# Altium footprint library CubeSat-Backplane.PcbLib: 54 footprints (part 2 of 4)
Each footprint in its own frame and in the unit in brackets; x right, y up, seen from the top. Pads: shape width x height; smd on the part's side, far side on the other; paste and mask are expansions set on the pad; w line width, h text height; cw(c..) or ccw(c..) is an arc to the next point about the centre after c.
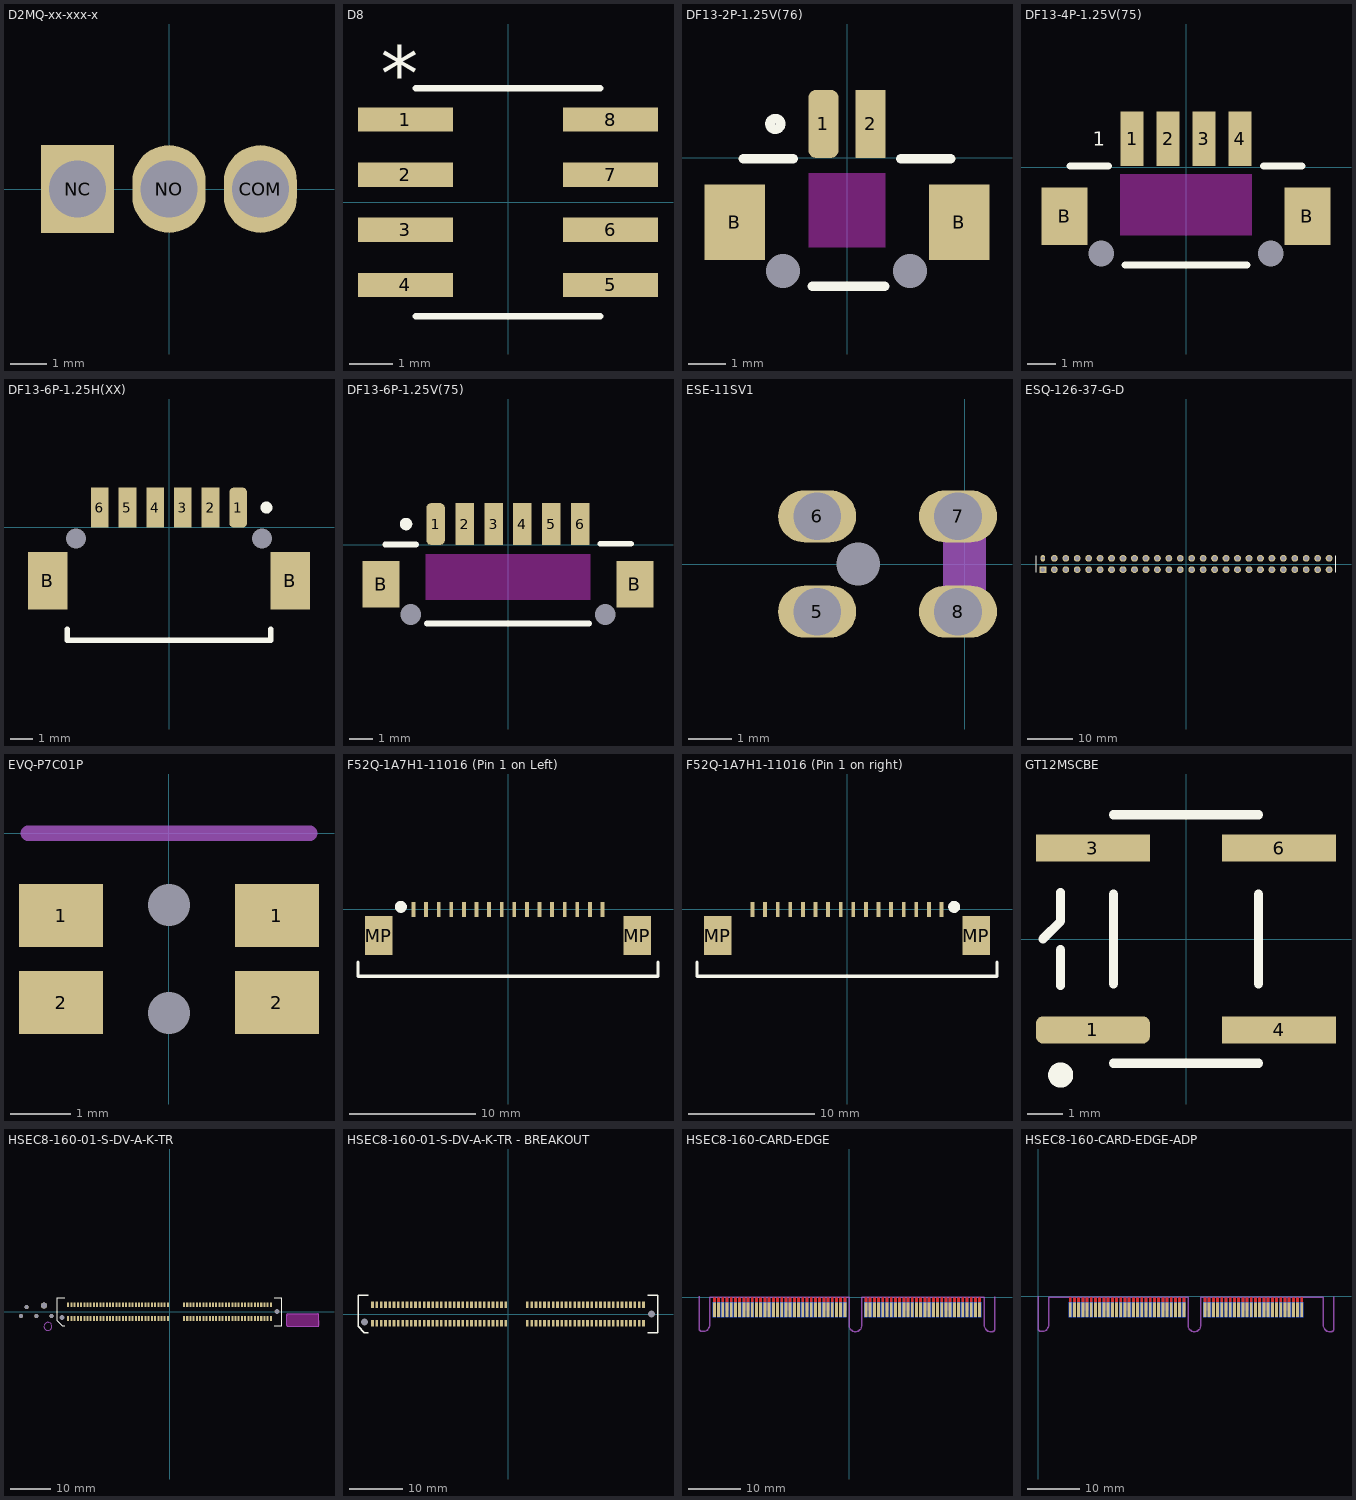
[diagram p1: the footprints below, top view; thin cyan lines are the x and y axes]

## D2MQ-xx-xxx-x [mm] "Switch SPDT Through Hole"
height 8.7
pads (3):
  oval 2x2.4 hole 1.55: COM(2.5,0) NO(0,0)
  rect 2x2.4 hole 1.55: NC(-2.5,0)
Bottom Overlay:
  lines w0.254: -3.75,-1.35 -4.1,-1.35 -4.1,1.35 -3.75,1.35 ; 3.75,-1.35 4.1,-1.35 4.1,1.35 3.75,1.35
3D body "D2MQ_4L_105_1.STEP": height 8.71, standoff -3.39, extent -4.1,-1.35 4.1,1.35

## D8 [mil]
pads (8):
  rect 86x22 smd paste+0 mask+0: 1(-93,75) 2(-93,25) 3(-93,-25) 4(-93,-75) 5(93,-75) 6(93,-25) 7(93,25) 8(93,75)
Top Overlay:
  lines w6: -83.5,-103.5 83.5,-103.5 ; -83.5,103.5 83.5,103.5
  text "*" at -115.5,92 h50
3D body: height 10, standoff 0, extent 0,0 10,10
3D body "D8.step": height 70.09, standoff 1, extent -122,-98.5 122.01,98.51

## DF13-2P-1.25V(76) [mm] "CONN HEADER SMD 2POS 1.25MM, TH PINS"
height 4.8
pads (6):
  rrect50% 0.8x1.8 smd: 1(-0.625,0.9)
  rect 0.8x1.8 smd: 2(0.625,0.9)
  rect 1.6x2 smd: B(-2.975,-1.7) B(2.975,-1.7)
  round 0 hole 0.9 unplated: TH(-1.7,-3) TH(1.675,-3)
Top Layer keep-out:
  rectangle: -1.025,-2.375 1.025,-0.4
Top Overlay:
  circle w0.254: c-1.9,0.9 r0.141
  lines w0.254: -2.75,-0.025 -1.425,-0.025 ; -0.925,-3.4 1,-3.4 ; 1.425,-0.025 2.75,-0.025
3D body "DF13-2P-1.25V.stp": height 4.81, standoff -0.79, extent -3.575,-3.4 3.575,1.5

## DF13-4P-1.25V(75) [mm] "CONN HEADER SMD 4POS 1.25MM, TH PINS"
height 4.8
pads (8):
  rect 0.8x1.9 smd: 1(-1.875,1) 2(-0.625,1) 3(0.625,1) 4(1.875,1)
  rect 1.6x2 smd: B(-4.225,-1.7) B(4.225,-1.7)
  round 0 hole 0.9 unplated: TH(-2.95,-3) TH(2.95,-3)
Top Layer keep-out:
  rectangle: -2.3,-2.375 2.3,-0.225
Top Overlay:
  lines w0.254: -4.038,0.05 -2.712,0.05 ; -2.125,-3.4 2.125,-3.4 ; 2.712,0.05 4.038,0.05
  text "1" at -3.25,0.75 h0.5
3D body "DF13-4P-1.25V.stp": height 4.81, standoff -0.79, extent -4.825,-3.4 4.825,1.5

## DF13-6P-1.25H(XX) [mm] "CONN HEADER SMD 6POS 1.25MM, RA - TH PINS"
height 3.6
pads (10):
  rrect50% 0.8x1.8 smd: 1(3.125,0.9)
  rect 0.8x1.8 smd: 2(1.875,0.9) 3(0.625,0.9) 4(-0.625,0.9) 5(-1.875,0.9) 6(-3.125,0.9)
  rect 1.8x2.6 smd: B(-5.475,-2.4) B(5.475,-2.4)
  round 0 hole 0.9 unplated: TH(-4.2,-0.5) TH(4.2,-0.5)
Top Overlay:
  circle w0.254: c4.4,0.9 r0.141
  lines w0.254: -4.6,-4.6 -4.6,-5.1 4.6,-5.1 4.6,-4.6
3D body "DF13-6P-1.25H.stp": height 3.61, standoff -0.79, extent -6.076,-5.1 6.076,1.4

## DF13-6P-1.25V(75) [mm] "CONN HEADER SMD 6POS 1.25MM, TH PINS"
height 4.8
pads (10):
  rrect50% 0.8x1.8 smd: 1(-3.125,0.9)
  rect 0.8x1.8 smd: 2(-1.875,0.9) 3(-0.625,0.9) 4(0.625,0.9) 5(1.875,0.9) 6(3.125,0.9)
  rect 1.6x2 smd: B(-5.475,-1.7) B(5.475,-1.7)
  round 0 hole 0.9 unplated: TH(-4.2,-3) TH(4.2,-3)
Top Layer keep-out:
  rectangle: -3.556,-2.375 3.556,-0.4
Top Overlay:
  circle w0.254: c-4.4,0.9 r0.141
  lines w0.254: -5.3,0.025 -3.975,0.025 ; -3.5,-3.4 3.5,-3.4 ; 3.982,0.05 5.308,0.05
3D body "DF13-6P-1.25V.stp": height 4.81, standoff -0.79, extent -6.075,-3.4 6.075,1.5

## ESE-11SV1 [mm] "SWITCH DETECTOR SPST-NO 10MA 5V"
height 8.5
pads (5):
  oval 1.8x1.2 hole 1.1: 5(-3.4,-1.1) 6(-3.4,1.1) 7(-0.15,1.1) 8(-0.15,-1.1)
  round 0 hole 1 unplated: 10(-2.45,0)
Mechanical 1:
  rectangle: -0.5,-0.635 0.5,0.635
  pour cut-out: -6.175,-1.475
3D body "ESE11SV1.step": height 10.7, standoff -0.5, extent -4.85,-2.098 1.55,2.099

## ESQ-126-37-G-D [mil] "CONN SOCKET 52POS 0.1 GOLD PCB"
height 435.04
pads (52):
  rect 60x60 hole 40 mask+3: 1(-1250,-50)
  oval 39.37x57.09 hole 25.59 mask+3: 2(-1250,50)
  round 60 hole 40 mask+3: 3(-1150,-50) 4(-1150,50) 5(-1050,-50) 6(-1050,50) 7(-950,-50) 8(-950,50) 9(-850,-50) 10(-850,50) 11(-750,-50) 12(-750,50) 13(-650,-50) 14(-650,50) 15(-550,-50) 16(-550,50) 17(-450,-50) 18(-450,50) 19(-350,-50) 20(-350,50) 21(-250,-50) 22(-250,50) 23(-150,-50) 24(-150,50) 25(-50,-50) 26(-50,50) 27(50,-50) 28(50,50) 29(150,-50) 30(150,50) 31(250,-50) 32(250,50) 33(350,-50) 34(350,50) 35(450,-50) 36(450,50) 37(550,-50) 38(550,50) 39(650,-50) 40(650,50) 41(750,-50) 42(750,50) 43(850,-50) 44(850,50) 45(950,-50) 46(950,50) 47(1050,-50) 48(1050,50) 49(1150,-50) 50(1150,50) 51(1250,-50) 52(1250,50)
Top Overlay:
  lines w10: -1310,-70 -1310,70 ; 1310,-70 1310,70
3D body "ESQ-126-37-G-D.stp": height 425.5, standoff -99.5, extent -1310,-100 1310,100

## EVQ-P7C01P [mm] "Tactile Switch SPST-NO Side Actuated Surface Mount, Right Angle"
height 1.35
pads (6):
  rect 1.4x1.05 smd: 1(-1.8,-1.375) 1(1.8,-1.375) 2(-1.8,-2.825) 2(1.8,-2.825)
  round 0 hole 0.7 unplated: TH(0,-3) TH(0,-1.2)
Board:
  lines w0.254: -2.35,0 2.35,0
3D body "EVQP7-LC-01P.SLDPRT": height 1.36, standoff -0.49, extent -2.35,-3.694 2.35,0

## F52Q-1A7H1-11016 (Pin 1 on Left) [mm] "FLEX CONNECTOR, 1.00MM PITCH, HE"
height 2
pads (18):
  rect 0.3x1.2 smd: 1(-7.5,0) 2(-6.5,0) 3(-5.5,0) 4(-4.5,0) 5(-3.5,0) 6(-2.5,0) 7(-1.5,0) 8(-0.5,0) 9(0.5,0) 10(1.5,0) 11(2.5,0) 12(3.5,0) 13(4.5,0) 14(5.5,0) 15(6.5,0) 16(7.5,0)
  rect 2.2x3.1 smd: MP(-10.25,-2.075) MP(10.25,-2.075)
Top Overlay:
  circle w0.5: c-8.5,0.2 r0.224
  lines w0.254: -11.9,-4.2 -11.9,-5.3 11.9,-5.3 11.9,-4.2
3D body "f52q_16pin_asm.stp": height 2.01, standoff -0.04, extent -11.9,-5.3 11.9,0.2

## F52Q-1A7H1-11016 (Pin 1 on right) [mm] "FLEX CONNECTOR, 1.00MM PITCH, HE"
height 2
pads (18):
  rect 0.3x1.2 smd: 1(7.5,0) 2(6.5,0) 3(5.5,0) 4(4.5,0) 5(3.5,0) 6(2.5,0) 7(1.5,0) 8(0.5,0) 9(-0.5,0) 10(-1.5,0) 11(-2.5,0) 12(-3.5,0) 13(-4.5,0) 14(-5.5,0) 15(-6.5,0) 16(-7.5,0)
  rect 2.2x3.1 smd: MP(-10.25,-2.075) MP(10.25,-2.075)
Top Overlay:
  circle w0.5: c8.5,0.2 r0.224
  lines w0.254: -11.9,-4.2 -11.9,-5.3 11.9,-5.3 11.9,-4.2
3D body "f52q_16pin_asm.stp": height 2.01, standoff -0.04, extent -11.9,-5.3 11.9,0.2

## GT12MSCBE [mm] "SWITCH TOGGLE SPST 0.4VA 20V, SMT"
height 5.41
pads (4):
  rrect50% 3.18x0.76 smd: 1(-2.6,-2.54)
  rect 3.18x0.76 smd: 3(-2.6,2.54) 4(2.6,-2.54) 6(2.6,2.54)
Top Overlay:
  circle w0.5: c-3.5,-3.8 r0.1
  lines w0.254: -4,0 -3.5,0.5 -3.5,1.3 ; -3.5,-1.3 -3.5,-0.3 ; -2.03,-3.47 2.03,-3.47 ; -2.03,-1.25 -2.03,1.25 ; -2.03,3.47 2.03,3.47 ; 2.03,-1.25 2.03,1.25
3D body: height 2.53, standoff -2.47, extent 0,0 0,0
3D body "GT12MSCBE.stp": height 11.37, standoff 0.01, extent -3.505,-3.505 3.505,3.505

## HSEC8-160-01-S-DV-A-K-TR [mm] "120 Position Female Connector Non Specified - Dual Edge Gold 0.031\" (0.80mm) Black"
height 7.98
pads (127):
  rect 0.5x1.2 smd mask+0.05: 1(-25.2,-1.7) 2(-25.2,1.7) 3(-24.4,-1.7) 4(-24.4,1.7) 5(-23.6,-1.7) 6(-23.6,1.7) 7(-22.8,-1.7) 8(-22.8,1.7) 9(-22,-1.7) 10(-22,1.7) 11(-21.2,-1.7) 12(-21.2,1.7) 13(-20.4,-1.7) 14(-20.4,1.7) 15(-19.6,-1.7) 16(-19.6,1.7) 17(-18.8,-1.7) 18(-18.8,1.7) 19(-18,-1.7) 20(-18,1.7) 21(-17.2,-1.7) 22(-17.2,1.7) 23(-16.4,-1.7) 24(-16.4,1.7) 25(-15.6,-1.7) 26(-15.6,1.7) 27(-14.8,-1.7) 28(-14.8,1.7) 29(-14,-1.7) 30(-14,1.7) 31(-13.2,-1.7) 32(-13.2,1.7) 33(-12.4,-1.7) 34(-12.4,1.7) 35(-11.6,-1.7) 36(-11.6,1.7) 37(-10.8,-1.7) 38(-10.8,1.7) 39(-10,-1.7) 40(-10,1.7) 41(-9.2,-1.7) 42(-9.2,1.7) 43(-8.4,-1.7) 44(-8.4,1.7) 45(-7.6,-1.7) 46(-7.6,1.7) 47(-6.8,-1.7) 48(-6.8,1.7) 49(-6,-1.7) 50(-6,1.7) 51(-5.2,-1.7) 52(-5.2,1.7) 53(-4.4,-1.7) 54(-4.4,1.7) 55(-3.6,-1.7) 56(-3.6,1.7) 57(-2.8,-1.7) 58(-2.8,1.7) 59(-2,-1.7) 60(-2,1.7) 61(-1.2,-1.7) 62(-1.2,1.7) 63(-0.4,-1.7) 64(-0.4,1.7) 65(3.6,-1.7) 66(3.6,1.7) 67(4.4,-1.7) 68(4.4,1.7) 69(5.2,-1.7) 70(5.2,1.7) 71(6,-1.7) 72(6,1.7) 73(6.8,-1.7) 74(6.8,1.7) 75(7.6,-1.7) 76(7.6,1.7) 77(8.4,-1.7) 78(8.4,1.7) 79(9.2,-1.7) 80(9.2,1.7) 81(10,-1.7) 82(10,1.7) 83(10.8,-1.7) 84(10.8,1.7) 85(11.6,-1.7) 86(11.6,1.7) 87(12.4,-1.7) 88(12.4,1.7) 89(13.2,-1.7) 90(13.2,1.7) 91(14,-1.7) 92(14,1.7) 93(14.8,-1.7) 94(14.8,1.7) 95(15.6,-1.7) 96(15.6,1.7) 97(16.4,-1.7) 98(16.4,1.7) 99(17.2,-1.7) 100(17.2,1.7) 101(18,-1.7) 102(18,1.7) 103(18.8,-1.7) 104(18.8,1.7) 105(19.6,-1.7) 106(19.6,1.7) 107(20.4,-1.7) 108(20.4,1.7) 109(21.2,-1.7) 110(21.2,1.7) 111(22,-1.7) 112(22,1.7) 113(22.8,-1.7) 114(22.8,1.7) 115(23.6,-1.7) 116(23.6,1.7) 117(24.4,-1.7) 118(24.4,1.7) 119(25.2,-1.7) 120(25.2,1.7)
  round 0 hole 1.27 unplated: MH1(-26.7,-1.5) MH2(26.7,0)
  round 1 hole 1 unplated: TH(-36.93,-1.1) TH(-35.53,1.1) TH(-33.13,-1.1) TH(-29.33,-1.1)
  round 1.5 hole 1.5 unplated: TH(-31.23,1.49)
Top Overlay:
  lines w0.254: -26,-3.5 -26.7,-3.5 -27.9,-2.3 -27.9,3.5 -26,3.5 ; 26,-3.5 27.9,-3.5 27.9,3.5 26,3.5
Keep-Out Layer:
  board cut-out: 37.157,-0.907 37.157,-3.343 37.157,-3.411 37.105,-3.536 37.01,-3.631 36.885,-3.683 36.817,-3.683 29.433,-3.683 29.374,-3.683 29.265,-3.638 29.182,-3.555 29.137,-3.446 29.137,-3.387 29.137,-0.863 29.137,-0.804 29.182,-0.694 29.266,-0.61 29.376,-0.565 29.435,-0.565 36.815,-0.565 36.883,-0.565 37.009,-0.617 37.105,-0.713 37.157,-0.839
Mechanical 1:
  circle w0.1: c-30.23,-3.69 r1
Dimensions:
  lines w0.203: 29.137,-0.833 29.137,-3.387 ccw(c29.433,-3.387) 29.433,-3.683 36.817,-3.683 ccw(c36.817,-3.343) 37.157,-3.343 37.157,-0.907 ; 29.139,-0.861 cw(c29.435,-0.861) 29.435,-0.565 36.815,-0.565 cw(c36.815,-0.907) 37.157,-0.907
3D body "HSEC8-160-01-S-DV-A-TR.stp": height 7.97, standoff -1.33, extent -27.9,-3.5 27.9,3.5

## HSEC8-160-01-S-DV-A-K-TR - BREAKOUT [mm] "120 Position Female Connector Non Specified - Dual Edge Gold 0.031\" (0.80mm) Black"
height 7.98
pads (122):
  rect 0.5x1.2 smd mask+0.05: 1(-25.2,-1.7) 2(-25.2,1.7) 3(-24.4,-1.7) 4(-24.4,1.7) 5(-23.6,-1.7) 6(-23.6,1.7) 7(-22.8,-1.7) 8(-22.8,1.7) 9(-22,-1.7) 10(-22,1.7) 11(-21.2,-1.7) 12(-21.2,1.7) 13(-20.4,-1.7) 14(-20.4,1.7) 15(-19.6,-1.7) 16(-19.6,1.7) 17(-18.8,-1.7) 18(-18.8,1.7) 19(-18,-1.7) 20(-18,1.7) 21(-17.2,-1.7) 22(-17.2,1.7) 23(-16.4,-1.7) 24(-16.4,1.7) 25(-15.6,-1.7) 26(-15.6,1.7) 27(-14.8,-1.7) 28(-14.8,1.7) 29(-14,-1.7) 30(-14,1.7) 31(-13.2,-1.7) 32(-13.2,1.7) 33(-12.4,-1.7) 34(-12.4,1.7) 35(-11.6,-1.7) 36(-11.6,1.7) 37(-10.8,-1.7) 38(-10.8,1.7) 39(-10,-1.7) 40(-10,1.7) 41(-9.2,-1.7) 42(-9.2,1.7) 43(-8.4,-1.7) 44(-8.4,1.7) 45(-7.6,-1.7) 46(-7.6,1.7) 47(-6.8,-1.7) 48(-6.8,1.7) 49(-6,-1.7) 50(-6,1.7) 51(-5.2,-1.7) 52(-5.2,1.7) 53(-4.4,-1.7) 54(-4.4,1.7) 55(-3.6,-1.7) 56(-3.6,1.7) 57(-2.8,-1.7) 58(-2.8,1.7) 59(-2,-1.7) 60(-2,1.7) 61(-1.2,-1.7) 62(-1.2,1.7) 63(-0.4,-1.7) 64(-0.4,1.7) 65(3.6,-1.7) 66(3.6,1.7) 67(4.4,-1.7) 68(4.4,1.7) 69(5.2,-1.7) 70(5.2,1.7) 71(6,-1.7) 72(6,1.7) 73(6.8,-1.7) 74(6.8,1.7) 75(7.6,-1.7) 76(7.6,1.7) 77(8.4,-1.7) 78(8.4,1.7) 79(9.2,-1.7) 80(9.2,1.7) 81(10,-1.7) 82(10,1.7) 83(10.8,-1.7) 84(10.8,1.7) 85(11.6,-1.7) 86(11.6,1.7) 87(12.4,-1.7) 88(12.4,1.7) 89(13.2,-1.7) 90(13.2,1.7) 91(14,-1.7) 92(14,1.7) 93(14.8,-1.7) 94(14.8,1.7) 95(15.6,-1.7) 96(15.6,1.7) 97(16.4,-1.7) 98(16.4,1.7) 99(17.2,-1.7) 100(17.2,1.7) 101(18,-1.7) 102(18,1.7) 103(18.8,-1.7) 104(18.8,1.7) 105(19.6,-1.7) 106(19.6,1.7) 107(20.4,-1.7) 108(20.4,1.7) 109(21.2,-1.7) 110(21.2,1.7) 111(22,-1.7) 112(22,1.7) 113(22.8,-1.7) 114(22.8,1.7) 115(23.6,-1.7) 116(23.6,1.7) 117(24.4,-1.7) 118(24.4,1.7) 119(25.2,-1.7) 120(25.2,1.7)
  round 0 hole 1.27 unplated: MH1(-26.7,-1.5) MH2(26.7,0)
Top Overlay:
  lines w0.254: -26,-3.5 -26.7,-3.5 -27.9,-2.3 -27.9,3.5 -26,3.5 ; 26,-3.5 27.9,-3.5 27.9,3.5 26,3.5
3D body "HSEC8-160-01-S-DV-A-TR.stp": height 7.97, standoff -1.33, extent -27.9,-3.5 27.9,3.5

## HSEC8-160-CARD-EDGE [mm] "PCB Card Edge Footprint for HSEC8-160"
pads (120):
  rect 0.55x2.8 smd far side paste-1 mask+0.2: 1(-25.6,-2.4) 3(-24.8,-2.4) 5(-24,-2.4) 7(-23.2,-2.4) 9(-22.4,-2.4) 11(-21.6,-2.4) 13(-20.8,-2.4) 15(-20,-2.4) 17(-19.2,-2.4) 19(-18.4,-2.4) 21(-17.6,-2.4) 23(-16.8,-2.4) 25(-16,-2.4) 27(-15.2,-2.4) 29(-14.4,-2.4) 31(-13.6,-2.4) 33(-12.8,-2.4) 35(-12,-2.4) 37(-11.2,-2.4) 39(-10.4,-2.4) 41(-9.6,-2.4) 43(-8.8,-2.4) 45(-8,-2.4) 47(-7.2,-2.4) 49(-6.4,-2.4) 51(-5.6,-2.4) 53(-4.8,-2.4) 55(-4,-2.4) 57(-3.2,-2.4) 59(-2.4,-2.4) 61(-1.6,-2.4) 63(-0.8,-2.4) 65(3.2,-2.4) 67(4,-2.4) 69(4.8,-2.4) 71(5.6,-2.4) 73(6.4,-2.4) 75(7.2,-2.4) 77(8,-2.4) 79(8.8,-2.4) 81(9.6,-2.4) 83(10.4,-2.4) 85(11.2,-2.4) 87(12,-2.4) 89(12.8,-2.4) 91(13.6,-2.4) 93(14.4,-2.4) 95(15.2,-2.4) 97(16,-2.4) 99(16.8,-2.4) 101(17.6,-2.4) 103(18.4,-2.4) 105(19.2,-2.4) 107(20,-2.4) 109(20.8,-2.4) 111(21.6,-2.4) 113(22.4,-2.4) 115(23.2,-2.4) 117(24,-2.4) 119(24.8,-2.4)
  rect 0.55x2.8 smd paste-1 mask+0.2: 2(-25.6,-2.4) 4(-24.8,-2.4) 6(-24,-2.4) 8(-23.2,-2.4) 10(-22.4,-2.4) 12(-21.6,-2.4) 14(-20.8,-2.4) 16(-20,-2.4) 18(-19.2,-2.4) 20(-18.4,-2.4) 22(-17.6,-2.4) 24(-16.8,-2.4) 26(-16,-2.4) 28(-15.2,-2.4) 30(-14.4,-2.4) 32(-13.6,-2.4) 34(-12.8,-2.4) 36(-12,-2.4) 38(-11.2,-2.4) 40(-10.4,-2.4) 42(-9.6,-2.4) 44(-8.8,-2.4) 46(-8,-2.4) 48(-7.2,-2.4) 50(-6.4,-2.4) 52(-5.6,-2.4) 54(-4.8,-2.4) 56(-4,-2.4) 58(-3.2,-2.4) 60(-2.4,-2.4) 62(-1.6,-2.4) 64(-0.8,-2.4) 66(3.2,-2.4) 68(4,-2.4) 70(4.8,-2.4) 72(5.6,-2.4) 74(6.4,-2.4) 76(7.2,-2.4) 78(8,-2.4) 80(8.8,-2.4) 82(9.6,-2.4) 84(10.4,-2.4) 86(11.2,-2.4) 88(12,-2.4) 90(12.8,-2.4) 92(13.6,-2.4) 94(14.4,-2.4) 96(15.2,-2.4) 98(16,-2.4) 100(16.8,-2.4) 102(17.6,-2.4) 104(18.4,-2.4) 106(19.2,-2.4) 108(20,-2.4) 110(20.8,-2.4) 112(21.6,-2.4) 114(22.4,-2.4) 116(23.2,-2.4) 118(24,-2.4) 120(24.8,-2.4)
Top Layer:
  lines w0.55: -25.6,-2.4 -25.6,-0.275 ; -24.8,-2.4 -24.8,-0.275 ; -24,-2.4 -24,-0.275 ; -23.2,-2.4 -23.2,-0.275 ; -22.4,-2.4 -22.4,-0.275 ; -21.6,-2.4 -21.6,-0.275 ; -20.8,-2.4 -20.8,-0.275 ; -20,-2.4 -20,-0.275 ; -19.2,-2.4 -19.2,-0.275 ; -18.4,-2.4 -18.4,-0.275 ; -17.6,-2.4 -17.6,-0.275 ; -16.8,-2.4 -16.8,-0.275 ; -16,-2.4 -16,-0.275 ; -15.2,-2.4 -15.2,-0.275 ; -14.4,-2.4 -14.4,-0.275 ; -13.6,-2.4 -13.6,-0.275 ; -12.8,-2.4 -12.8,-0.275 ; -12,-2.4 -12,-0.275 ; -11.2,-2.4 -11.2,-0.275 ; -10.4,-2.4 -10.4,-0.275 ; -9.6,-2.4 -9.6,-0.275 ; -8.8,-2.4 -8.8,-0.275 ; -8,-2.4 -8,-0.275 ; -7.2,-2.4 -7.2,-0.275 ; -6.4,-2.4 -6.4,-0.275 ; -5.6,-2.4 -5.6,-0.275 ; -4.8,-2.4 -4.8,-0.275 ; -4,-2.4 -4,-0.275 ; -3.2,-2.4 -3.2,-0.275 ; -2.4,-2.4 -2.4,-0.275 ; -1.6,-2.4 -1.6,-0.275 ; -0.8,-2.4 -0.8,-0.275 ; 3.2,-2.4 3.2,-0.275 ; 4,-2.4 4,-0.275 ; 4.8,-2.4 4.8,-0.275 ; 5.6,-2.4 5.6,-0.275 ; 6.4,-2.4 6.4,-0.275 ; 7.2,-2.4 7.2,-0.275 ; 8,-2.4 8,-0.275 ; 8.8,-2.4 8.8,-0.275 ; 9.6,-2.4 9.6,-0.275 ; 10.4,-2.4 10.4,-0.275 ; 11.2,-2.4 11.2,-0.275 ; 12,-2.4 12,-0.275 ; 12.8,-2.4 12.8,-0.275 ; 13.6,-2.4 13.6,-0.275 ; 14.4,-2.4 14.4,-0.275 ; 15.2,-2.4 15.2,-0.275 ; 16,-2.4 16,-0.275 ; 16.8,-2.4 16.8,-0.275 ; 17.6,-2.4 17.6,-0.275 ; 18.4,-2.4 18.4,-0.275 ; 19.2,-2.4 19.2,-0.275 ; 20,-2.4 20,-0.275 ; 20.8,-2.4 20.8,-0.275 ; 21.6,-2.4 21.6,-0.275 ; 22.4,-2.4 22.4,-0.275 ; 23.2,-2.4 23.2,-0.275 ; 24,-2.4 24,-0.275 ; 24.8,-2.4 24.8,-0.275
Bottom Layer:
  lines w0.55: -25.6,-2.4 -25.6,-0.275 ; -24.8,-2.4 -24.8,-0.275 ; -24,-2.4 -24,-0.275 ; -23.2,-2.4 -23.2,-0.275 ; -22.4,-2.4 -22.4,-0.275 ; -21.6,-2.4 -21.6,-0.275 ; -20.8,-2.4 -20.8,-0.275 ; -20,-2.4 -20,-0.275 ; -19.2,-2.4 -19.2,-0.275 ; -18.4,-2.4 -18.4,-0.275 ; -17.6,-2.4 -17.6,-0.275 ; -16.8,-2.4 -16.8,-0.275 ; -16,-2.4 -16,-0.275 ; -15.2,-2.4 -15.2,-0.275 ; -14.4,-2.4 -14.4,-0.275 ; -13.6,-2.4 -13.6,-0.275 ; -12.8,-2.4 -12.8,-0.275 ; -12,-2.4 -12,-0.275 ; -11.2,-2.4 -11.2,-0.275 ; -10.4,-2.4 -10.4,-0.275 ; -9.6,-2.4 -9.6,-0.275 ; -8.8,-2.4 -8.8,-0.275 ; -8,-2.4 -8,-0.275 ; -7.2,-2.4 -7.2,-0.275 ; -6.4,-2.4 -6.4,-0.275 ; -5.6,-2.4 -5.6,-0.275 ; -4.8,-2.4 -4.8,-0.275 ; -4,-2.4 -4,-0.275 ; -3.2,-2.4 -3.2,-0.275 ; -2.4,-2.4 -2.4,-0.275 ; -1.6,-2.4 -1.6,-0.275 ; -0.8,-2.4 -0.8,-0.275 ; 3.2,-2.4 3.2,-0.275 ; 4,-2.4 4,-0.275 ; 4.8,-2.4 4.8,-0.275 ; 5.6,-2.4 5.6,-0.275 ; 6.4,-2.4 6.4,-0.275 ; 7.2,-2.4 7.2,-0.275 ; 8,-2.4 8,-0.275 ; 8.8,-2.4 8.8,-0.275 ; 9.6,-2.4 9.6,-0.275 ; 10.4,-2.4 10.4,-0.275 ; 11.2,-2.4 11.2,-0.275 ; 12,-2.4 12,-0.275 ; 12.8,-2.4 12.8,-0.275 ; 13.6,-2.4 13.6,-0.275 ; 14.4,-2.4 14.4,-0.275 ; 15.2,-2.4 15.2,-0.275 ; 16,-2.4 16,-0.275 ; 16.8,-2.4 16.8,-0.275 ; 17.6,-2.4 17.6,-0.275 ; 18.4,-2.4 18.4,-0.275 ; 19.2,-2.4 19.2,-0.275 ; 20,-2.4 20,-0.275 ; 20.8,-2.4 20.8,-0.275 ; 21.6,-2.4 21.6,-0.275 ; 22.4,-2.4 22.4,-0.275 ; 23.2,-2.4 23.2,-0.275 ; 24,-2.4 24,-0.275 ; 24.8,-2.4 24.8,-0.275
Top Solder:
  rectangle: -26.775,-4 26.1,0.15
Bottom Solder:
  rectangle: -26.775,-4 26.1,0.15
Board:
  lines w0.254: -28.5,0.15 -28.5,-5.95 ccw(c-27.925,-5.95) -27.925,-6.525 -27.7,-6.525 ccw(c-27.7,-5.325) -26.5,-5.325 -26.5,0 0,0 0,-5.375 ccw(c1.2,-5.375) 2.4,-5.375 2.4,0 ; 27.7,0.1 27.7,-6 cw(c27.125,-6) 27.125,-6.575 26.9,-6.575 cw(c26.9,-5.375) 25.7,-5.375 25.7,0 2.4,0 ; 2.4,0 2.4,0

## HSEC8-160-CARD-EDGE-ADP [mm] "PCB Card Edge Footprint for HSEC8-160"
pads (104):
  rect 0.55x2.8 smd far side paste-1 mask+0.2: 9(6.1,-2.55) 11(6.9,-2.55) 13(7.7,-2.55) 15(8.5,-2.55) 17(9.3,-2.55) 19(10.1,-2.55) 21(10.9,-2.55) 23(11.7,-2.55) 25(12.5,-2.55) 27(13.3,-2.55) 29(14.1,-2.55) 31(14.9,-2.55) 33(15.7,-2.55) 35(16.5,-2.55) 37(17.3,-2.55) 39(18.1,-2.55) 41(18.9,-2.55) 43(19.7,-2.55) 45(20.5,-2.55) 47(21.3,-2.55) 49(22.1,-2.55) 51(22.9,-2.55) 53(23.7,-2.55) 55(24.5,-2.55) 57(25.3,-2.55) 59(26.1,-2.55) 61(26.9,-2.55) 63(27.7,-2.55) 65(31.7,-2.55) 67(32.5,-2.55) 69(33.3,-2.55) 71(34.1,-2.55) 73(34.9,-2.55) 75(35.7,-2.55) 77(36.5,-2.55) 79(37.3,-2.55) 81(38.1,-2.55) 83(38.9,-2.55) 85(39.7,-2.55) 87(40.5,-2.55) 89(41.3,-2.55) 91(42.1,-2.55) 93(42.9,-2.55) 95(43.7,-2.55) 97(44.5,-2.55) 99(45.3,-2.55) 101(46.1,-2.55) 103(46.9,-2.55) 105(47.7,-2.55) 107(48.5,-2.55) 109(49.3,-2.55) 111(50.1,-2.55)
  rect 0.55x2.8 smd paste-1 mask+0.2: 10(6.1,-2.55) 12(6.9,-2.55) 14(7.7,-2.55) 16(8.5,-2.55) 18(9.3,-2.55) 20(10.1,-2.55) 22(10.9,-2.55) 24(11.7,-2.55) 26(12.5,-2.55) 28(13.3,-2.55) 30(14.1,-2.55) 32(14.9,-2.55) 34(15.7,-2.55) 36(16.5,-2.55) 38(17.3,-2.55) 40(18.1,-2.55) 42(18.9,-2.55) 44(19.7,-2.55) 46(20.5,-2.55) 48(21.3,-2.55) 50(22.1,-2.55) 52(22.9,-2.55) 54(23.7,-2.55) 56(24.5,-2.55) 58(25.3,-2.55) 60(26.1,-2.55) 62(26.9,-2.55) 64(27.7,-2.55) 66(31.7,-2.55) 68(32.5,-2.55) 70(33.3,-2.55) 72(34.1,-2.55) 74(34.9,-2.55) 76(35.7,-2.55) 78(36.5,-2.55) 80(37.3,-2.55) 82(38.1,-2.55) 84(38.9,-2.55) 86(39.7,-2.55) 88(40.5,-2.55) 90(41.3,-2.55) 92(42.1,-2.55) 94(42.9,-2.55) 96(43.7,-2.55) 98(44.5,-2.55) 100(45.3,-2.55) 102(46.1,-2.55) 104(46.9,-2.55) 106(47.7,-2.55) 108(48.5,-2.55) 110(49.3,-2.55) 112(50.1,-2.55)
Top Layer:
  lines w0.55: 6.1,-2.55 6.1,-0.425 ; 6.9,-2.55 6.9,-0.425 ; 7.7,-2.55 7.7,-0.425 ; 8.5,-2.55 8.5,-0.425 ; 9.3,-2.55 9.3,-0.425 ; 10.1,-2.55 10.1,-0.425 ; 10.9,-2.55 10.9,-0.425 ; 11.7,-2.55 11.7,-0.425 ; 12.5,-2.55 12.5,-0.425 ; 13.3,-2.55 13.3,-0.425 ; 14.1,-2.55 14.1,-0.425 ; 14.9,-2.55 14.9,-0.425 ; 15.7,-2.55 15.7,-0.425 ; 16.5,-2.55 16.5,-0.425 ; 17.3,-2.55 17.3,-0.425 ; 18.1,-2.55 18.1,-0.425 ; 18.9,-2.55 18.9,-0.425 ; 19.7,-2.55 19.7,-0.425 ; 20.5,-2.55 20.5,-0.425 ; 21.3,-2.55 21.3,-0.425 ; 22.1,-2.55 22.1,-0.425 ; 22.9,-2.55 22.9,-0.425 ; 23.7,-2.55 23.7,-0.425 ; 24.5,-2.55 24.5,-0.425 ; 25.3,-2.55 25.3,-0.425 ; 26.1,-2.55 26.1,-0.425 ; 26.9,-2.55 26.9,-0.425 ; 27.7,-2.55 27.7,-0.425 ; 31.7,-2.55 31.7,-0.425 ; 32.5,-2.55 32.5,-0.425 ; 33.3,-2.55 33.3,-0.425 ; 34.1,-2.55 34.1,-0.425 ; 34.9,-2.55 34.9,-0.425 ; 35.7,-2.55 35.7,-0.425 ; 36.5,-2.55 36.5,-0.425 ; 37.3,-2.55 37.3,-0.425 ; 38.1,-2.55 38.1,-0.425 ; 38.9,-2.55 38.9,-0.425 ; 39.7,-2.55 39.7,-0.425 ; 40.5,-2.55 40.5,-0.425 ; 41.3,-2.55 41.3,-0.425 ; 42.1,-2.55 42.1,-0.425 ; 42.9,-2.55 42.9,-0.425 ; 43.7,-2.55 43.7,-0.425 ; 44.5,-2.55 44.5,-0.425 ; 45.3,-2.55 45.3,-0.425 ; 46.1,-2.55 46.1,-0.425 ; 46.9,-2.55 46.9,-0.425 ; 47.7,-2.55 47.7,-0.425 ; 48.5,-2.55 48.5,-0.425 ; 49.3,-2.55 49.3,-0.425 ; 50.1,-2.55 50.1,-0.425
Bottom Layer:
  lines w0.55: 6.1,-2.55 6.1,-0.425 ; 6.9,-2.55 6.9,-0.425 ; 7.7,-2.55 7.7,-0.425 ; 8.5,-2.55 8.5,-0.425 ; 9.3,-2.55 9.3,-0.425 ; 10.1,-2.55 10.1,-0.425 ; 10.9,-2.55 10.9,-0.425 ; 11.7,-2.55 11.7,-0.425 ; 12.5,-2.55 12.5,-0.425 ; 13.3,-2.55 13.3,-0.425 ; 14.1,-2.55 14.1,-0.425 ; 14.9,-2.55 14.9,-0.425 ; 15.7,-2.55 15.7,-0.425 ; 16.5,-2.55 16.5,-0.425 ; 17.3,-2.55 17.3,-0.425 ; 18.1,-2.55 18.1,-0.425 ; 18.9,-2.55 18.9,-0.425 ; 19.7,-2.55 19.7,-0.425 ; 20.5,-2.55 20.5,-0.425 ; 21.3,-2.55 21.3,-0.425 ; 22.1,-2.55 22.1,-0.425 ; 22.9,-2.55 22.9,-0.425 ; 23.7,-2.55 23.7,-0.425 ; 24.5,-2.55 24.5,-0.425 ; 25.3,-2.55 25.3,-0.425 ; 26.1,-2.55 26.1,-0.425 ; 26.9,-2.55 26.9,-0.425 ; 27.7,-2.55 27.7,-0.425 ; 31.7,-2.55 31.7,-0.425 ; 32.5,-2.55 32.5,-0.425 ; 33.3,-2.55 33.3,-0.425 ; 34.1,-2.55 34.1,-0.425 ; 34.9,-2.55 34.9,-0.425 ; 35.7,-2.55 35.7,-0.425 ; 36.5,-2.55 36.5,-0.425 ; 37.3,-2.55 37.3,-0.425 ; 38.1,-2.55 38.1,-0.425 ; 38.9,-2.55 38.9,-0.425 ; 39.7,-2.55 39.7,-0.425 ; 40.5,-2.55 40.5,-0.425 ; 41.3,-2.55 41.3,-0.425 ; 42.1,-2.55 42.1,-0.425 ; 42.9,-2.55 42.9,-0.425 ; 43.7,-2.55 43.7,-0.425 ; 44.5,-2.55 44.5,-0.425 ; 45.3,-2.55 45.3,-0.425 ; 46.1,-2.55 46.1,-0.425 ; 46.9,-2.55 46.9,-0.425 ; 47.7,-2.55 47.7,-0.425 ; 48.5,-2.55 48.5,-0.425 ; 49.3,-2.55 49.3,-0.425 ; 50.1,-2.55 50.1,-0.425
Top Solder:
  rectangle: 1.775,-4.15 54.375,0
Bottom Solder:
  rectangle: 1.75,-4.15 54.375,0
Board:
  lines w0.254: 0,0 0,-6.1 ccw(c0.575,-6.1) 0.575,-6.675 0.8,-6.675 ccw(c0.8,-5.475) 2,-5.475 2,-0.15 28.5,-0.15 28.5,-5.525 ccw(c29.7,-5.525) 30.9,-5.525 30.9,-0.15 ; 56.2,-0.05 56.2,-6.15 cw(c55.625,-6.15) 55.625,-6.725 55.4,-6.725 cw(c55.4,-5.525) 54.2,-5.525 54.2,-0.15 30.9,-0.15 ; 30.9,-0.15 30.9,-0.15